# Altium footprint library Iris.PcbLib: 90 footprints (part 4 of 6)
Each footprint in its own frame and in the unit in brackets; x right, y up, seen from the top. Pads: shape width x height; smd on the part's side, far side on the other; paste and mask are expansions set on the pad; w line width, h text height; cw(c..) or ccw(c..) is an arc to the next point about the centre after c.
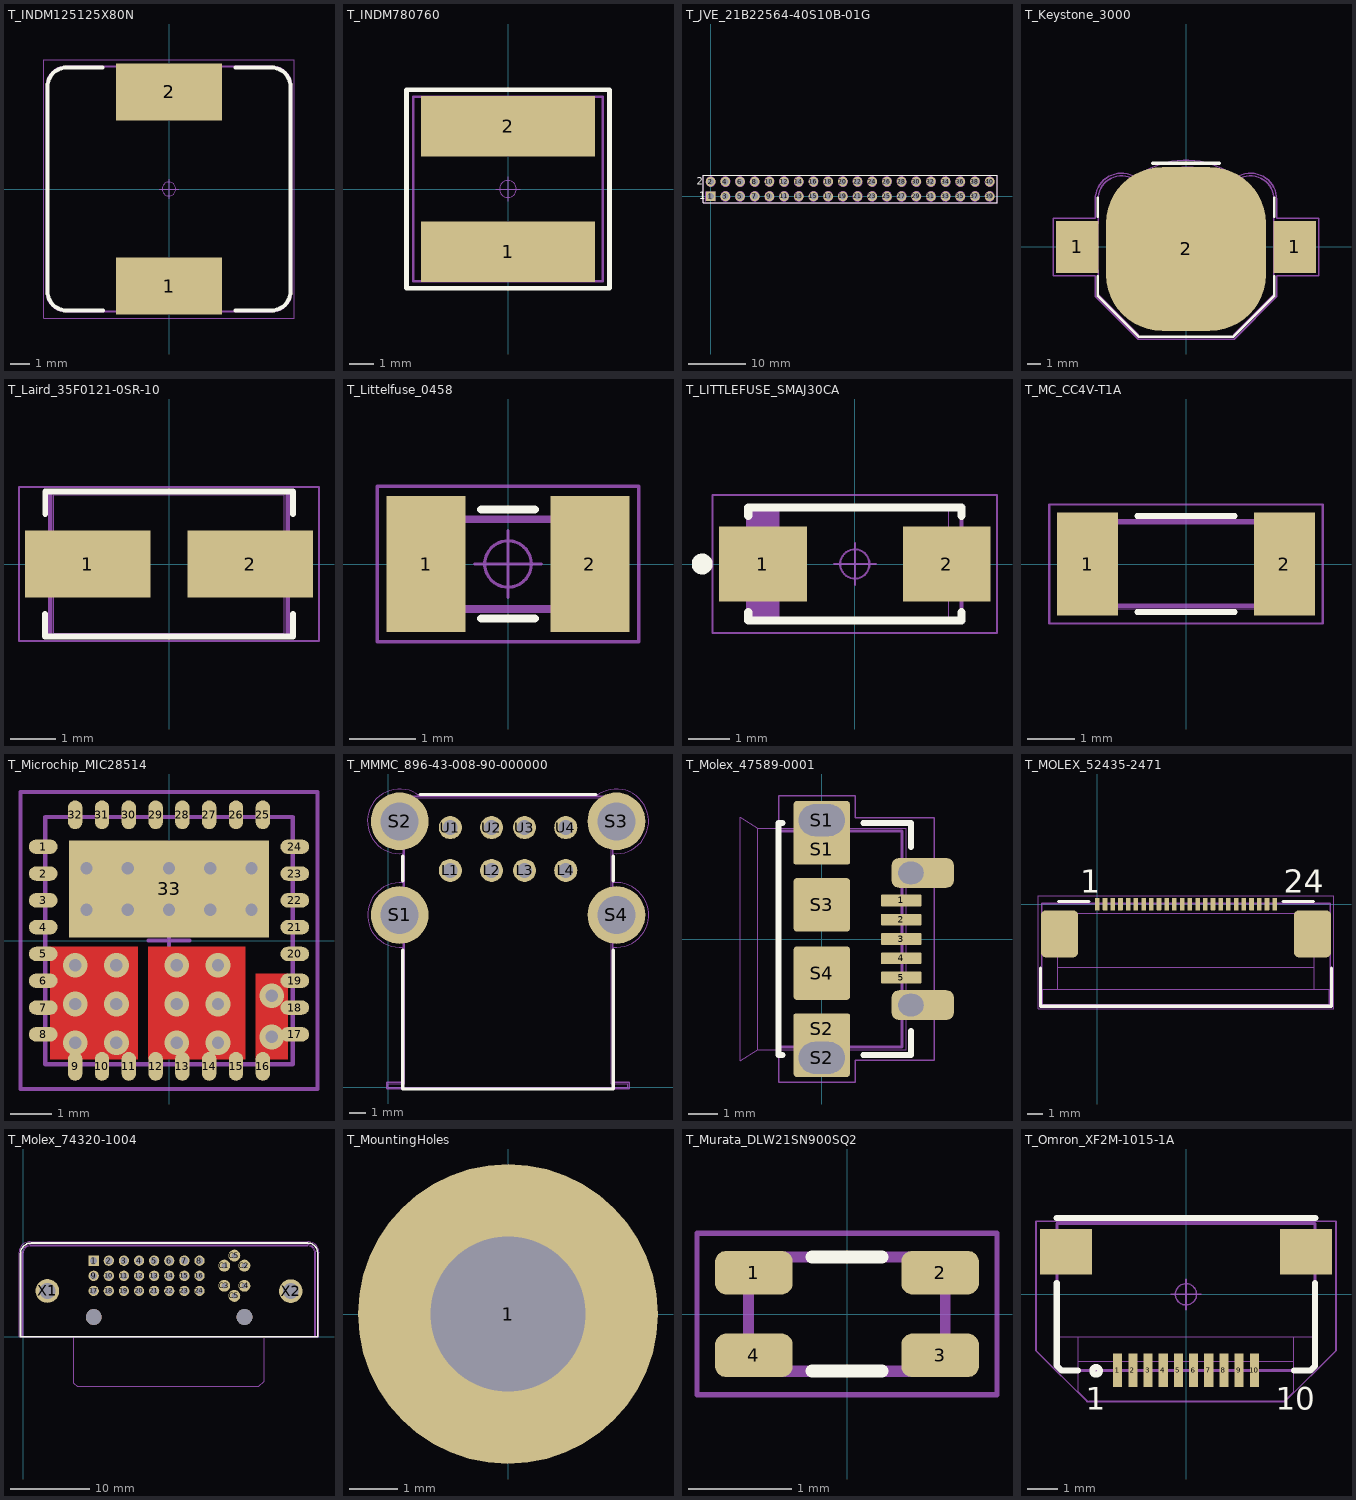
[diagram p3: the footprints below, top view; thin cyan lines are the x and y axes]

## T_INDM125125X80N [mm] "Inductor shielded, 12.5mm X 12.5mm"
height 6
pads (2):
  rect 5.4x2.9 smd: 1(0,-4.95) 2(0,4.95)
Top Overlay:
  lines w0.2: -3.39,6.2 -5.2,6.2 ccw(c-5.2,5.2) -6.2,5.2 -6.2,-5.2 ccw(c-5.2,-5.2) -5.2,-6.2 -3.373,-6.2 ; 3.382,-6.2 5.2,-6.2 ccw(c5.2,-5.2) 6.2,-5.2 6.2,5.2 ccw(c5.2,5.2) 5.2,6.2 ; 3.393,6.196 5.2,6.196
Mechanical 1:
  circle w0.05: c0,0 r0.35
  lines w0.05: -0.5,0 0.5,0 ; 0,-0.5 0,0.5 ; -6.4,-6.6 -6.4,6.6 6.4,6.6 6.4,-6.6 -6.4,-6.6
Mechanical 2:
  lines w0.005: -6.25,-5.25 ccw(c-5.25,-5.25) -5.251,-6.25 5.25,-6.25 ccw(c5.25,-5.25) 6.25,-5.251 6.25,5.25 ccw(c5.25,5.25) 5.251,6.25 -5.25,6.25 ccw(c-5.25,5.25) -6.25,5.251 -6.25,-5.25
Mechanical 3:
  lines w0.1: -6.25,-5.25 ccw(c-5.25,-5.25) -5.251,-6.25 5.25,-6.25 ccw(c5.25,-5.25) 6.25,-5.251 6.25,5.25 ccw(c5.25,5.25) 5.251,6.25 -5.25,6.25 ccw(c-5.25,5.25) -6.25,5.251 -6.25,-5.25
3D body "srr1260-330m.stp": height 6, standoff 0, extent -6.25,-6.25 6.25,6.25

## T_INDM780760 [mm] "Inductor shielded, 7.80mm x 7.60mm (Pulse, PA5007.332NLT; Abracon, ASPIAIG-F7030-3R3M-T)"
height 3.5
pads (2):
  rect 7.2x2.5 smd: 1(0,-2.6) 2(0,2.6)
Top Overlay:
  lines w0.2: -4.2,-4.1 -4.2,4.1 4.2,4.1 4.2,-4.1 -4.2,-4.1
Mechanical 1:
  circle w0.05: c0,0 r0.35
  lines w0.05: -0.5,0 0.5,0 ; 0,-0.5 0,0.5 ; -4.191,-4.089 4.191,-4.089 4.191,4.089 -4.191,4.089 -4.191,-4.089
Mechanical 2:
  lines w0.01: -3.9,-3.8 -3.9,3.8 3.9,3.8 3.9,-3.8 -3.9,-3.8 ; -3.1,-3.722 3.1,-3.722 3.1,-1.772 -3.1,-1.772 -3.1,-3.722 ; -3.1,1.772 3.1,1.772 3.1,3.722 -3.1,3.722 -3.1,1.772
Mechanical 3:
  lines w0.1: -3.912,-3.81 -3.912,3.81 3.912,3.81 3.912,-3.81 -3.912,-3.81
3D body: height 3.1, standoff 0.2, extent -3.9,-3.8 3.9,3.8

## T_JVE_21B22564-40S10B-01G [mm] "Header 2x20"
height 8.6
pads (40):
  rect 1.65x1.65 hole 1.15: 1(0,0)
  round 1.65 hole 1.15: 2(0,2.54) 3(2.54,0) 4(2.54,2.54) 5(5.08,0) 6(5.08,2.54) 7(7.62,0) 8(7.62,2.54) 9(10.16,0) 10(10.16,2.54) 11(12.7,0) 12(12.7,2.54) 13(15.24,0) 14(15.24,2.54) 15(17.78,0) 16(17.78,2.54) 17(20.32,0) 18(20.32,2.54) 19(22.86,0) 20(22.86,2.54) 21(25.4,0) 22(25.4,2.54) 23(27.94,0) 24(27.94,2.54) 25(30.48,0) 26(30.48,2.54) 27(33.02,0) 28(33.02,2.54) 29(35.56,0) 30(35.56,2.54) 31(38.1,0) 32(38.1,2.54) 33(40.64,0) 34(40.64,2.54) 35(43.18,0) 36(43.18,2.54) 37(45.72,0) 38(45.72,2.54) 39(48.26,0) 40(48.26,2.54)
Top Overlay:
  lines w0.2: -1.27,-1.14 49.53,-1.14 49.53,3.68 -1.27,3.68 -1.27,-1.137
  text "2" at -2.364,2.048 h1.27
  text "1" at -1.941,-0.522 h1.27
Mechanical 1:
  circle w0.05: c0,0 r0.35
  lines w0.05: -1.27,-1.14 49.53,-1.14 49.53,3.68 -1.27,3.68 -1.27,-1.137 ; -0.5,0 0.5,0 ; 0,-0.5 0,0.5
Mechanical 2:
  lines w0.001: -1.27,-1.14 49.53,-1.14 49.53,3.68 -1.27,3.68 -1.27,-1.14
Mechanical 3:
  circle w0.1: c0,2.54 r0.825
  circle w0.1: c2.54,0 r0.825
  circle w0.1: c2.54,2.54 r0.825
  circle w0.1: c5.08,0 r0.825
  circle w0.1: c5.08,2.54 r0.825
  circle w0.1: c7.62,0 r0.825
  circle w0.1: c7.62,2.54 r0.825
  circle w0.1: c10.16,0 r0.825
  circle w0.1: c10.16,2.54 r0.825
  circle w0.1: c12.7,0 r0.825
  circle w0.1: c12.7,2.54 r0.825
  circle w0.1: c15.24,0 r0.825
  circle w0.1: c15.24,2.54 r0.825
  circle w0.1: c17.78,0 r0.825
  circle w0.1: c17.78,2.54 r0.825
  circle w0.1: c20.32,0 r0.825
  circle w0.1: c20.32,2.54 r0.825
  circle w0.1: c22.86,0 r0.825
  circle w0.1: c22.86,2.54 r0.825
  circle w0.1: c25.4,0 r0.825
  circle w0.1: c25.4,2.54 r0.825
  circle w0.1: c27.94,0 r0.825
  circle w0.1: c27.94,2.54 r0.825
  circle w0.1: c30.48,0 r0.825
  circle w0.1: c30.48,2.54 r0.825
  circle w0.1: c33.02,0 r0.825
  circle w0.1: c33.02,2.54 r0.825
  circle w0.1: c35.56,0 r0.825
  circle w0.1: c35.56,2.54 r0.825
  circle w0.1: c38.1,0 r0.825
  circle w0.1: c38.1,2.54 r0.825
  circle w0.1: c40.64,0 r0.825
  circle w0.1: c40.64,2.54 r0.825
  circle w0.1: c43.18,0 r0.825
  circle w0.1: c43.18,2.54 r0.825
  circle w0.1: c45.72,0 r0.825
  circle w0.1: c45.72,2.54 r0.825
  circle w0.1: c48.26,0 r0.825
  circle w0.1: c48.26,2.54 r0.825
  lines w0.1: -1.27,-1.14 49.53,-1.14 49.53,3.68 -1.27,3.68 -1.27,-1.137 ; -0.825,-0.825 -0.825,0.825 0.825,0.825 0.825,-0.825
3D body "TSW-120-07-X-D.step": height 8.4, standoff -2.52, extent -1.27,-1.27 49.53,3.81

## T_Keystone_3000 [mm] "Battery Holder"
height 3.2
pads (3):
  rect 3.2x3.9 smd: 1(-8.17,0) 1(8.17,0)
  rrect70% 12x12.3 smd paste-11: 2(0,-0.15)
Top Overlay:
  lines w0.2: -6.631,-2.21 -6.631,-3.638 -3.517,-6.752 3.523,-6.752 3.523,-6.746 6.631,-3.638 6.631,-2.21 ; -6.631,2.261 -6.631,3.689 ; 6.631,2.261 6.631,3.689
  lines w0.254: -2.5,6.3 2.5,6.3
Mechanical 1:
  lines w0.1: -6.808,3.568 cw(c-4.849,3.588) -3.782,5.231 ; -6.808,3.588 -6.808,2.159 -9.982,2.159 -9.982,-2.159 -6.807,-2.159 -6.807,-3.683 -3.581,-6.909 3.607,-6.909 6.833,-3.683 6.833,-2.159 9.982,-2.159 9.982,2.159 6.809,2.159 6.809,3.57 ; -3.785,5.233 cw(c0,0.323) 3.785,5.233 ; 3.782,5.231 cw(c4.849,3.588) 6.807,3.568
Mechanical 2:
  circle w0.001: c-8.185,0 r1.2
  circle w0.001: c8.185,0 r1.2
  circle w0.001: c0,0 r6
  lines w0.001: -6.605,-1.585 -9.46,-1.585 -9.46,1.585 -6.605,1.585 ; -6.605,3.588 -6.605,-3.57 -6.59,-3.57 -3.57,-6.59 -3.57,-6.725 3.57,-6.725 3.57,-6.59 6.59,-3.57 6.605,-3.57 6.605,3.588 ; -6.605,3.57 cw(c-4.849,3.588) -3.585,4.808 ccw(c0,9.619) 3.586,4.808 cw(c4.849,3.588) 6.605,3.57 ; -3.57,5.345 3.57,5.345 ; 6.605,-1.585 9.46,-1.585 9.46,1.585 6.605,1.585
Mechanical 3:
  lines w0.1: -6.605,-1.723 -6.605,-3.57 -6.59,-3.57 -3.57,-6.59 -3.57,-6.725 3.57,-6.725 3.57,-6.59 6.59,-3.57 6.605,-3.57 6.605,-1.723 ; -6.604,-1.723 -9.578,-1.723 -9.578,1.727 -6.605,1.727 -6.605,3.57 cw(c-4.849,3.588) -3.585,4.808 ccw(c0,9.619) 3.586,4.808 cw(c4.849,3.588) 6.605,3.57 ; 6.604,-1.724 9.575,-1.724 9.575,1.73 6.605,1.73 ; 6.605,1.727 6.605,3.57
3D body "keystone-PN3000.STEP": height 3.16, standoff -0.01, extent -9.474,-6.72 9.474,5.345

## T_Laird_35F0121-0SR-10 [mm] "Power supply FB 10A"
height 3.05
pads (2):
  rect 2.77x1.47 smd: 1(-1.79,0) 2(1.79,0)
Top Overlay:
  lines w0.127: -2.732,-1.102 -2.732,-1.599 2.73,-1.599 2.73,-1.104 ; -2.729,1.104 -2.729,1.599 2.73,1.599 2.73,1.104
Mechanical 1:
  lines w0.05: -3.306,-1.695 3.305,-1.695 3.305,1.695 -3.306,1.695 -3.306,-1.695
Mechanical 2:
  lines w0.001: -2.54,-1.525 2.54,-1.525 2.54,1.525 -2.54,1.525 -2.54,-1.525
Mechanical 3:
  lines w0.1: -2.614,-1.599 -2.614,1.599 2.614,1.599 2.614,-1.599 -2.614,-1.599
3D body: height 3.05, standoff 0, extent -2.54,-1.525 2.54,1.525

## T_Littelfuse_0458 [mm] "Fast Fuse"
height 1.575
pads (2):
  rect 1.185x2.05 smd: 1(-1.232,0) 2(1.232,0)
Top Overlay:
  lines w0.127: -0.4,-0.82 0.4,-0.82 ; -0.4,0.82 0.4,0.82
Mechanical 1:
  circle w0.05: c0,0 r0.35
  lines w0.05: -0.5,0 0.5,0 ; 0,-0.5 0,0.5 ; -1.97,-1.17 1.97,-1.17 1.97,1.17 -1.97,1.17 -1.97,-1.17
Mechanical 2:
  lines w0.005: -1.587,-0.725 1.587,-0.725 1.587,0.725 -1.587,0.725 -1.587,-0.725
Mechanical 3:
  lines w0.1: -1.53,-0.67 1.53,-0.67 1.53,0.67 -1.53,0.67 -1.53,-0.67
3D body "User Library-Fast Acting Surface-Mount Fuses (1).step": height 1.1, standoff 0, extent -1.51,-0.801 1.51,0.801

## T_LITTLEFUSE_SMAJ30CA [mm] "Bidirectional ESD protection"
height 2.29
pads (2):
  rect 2.1x1.8 smd: 1(-2.2,0) 2(2.2,0)
Top Overlay:
  circle w0.25: c-3.65,0 r0.125
  lines w0.2: -2.55,-1.15 -2.55,-1.35 2.55,-1.35 2.55,-1.15 ; -2.55,1.15 -2.55,1.35 2.55,1.35 2.55,1.15
Mechanical 1:
  circle w0.05: c0,0 r0.35
  lines w0.05: -0.5,0 0.5,0 ; 0,-0.5 0,0.5 ; -3.4,-1.65 -3.4,1.65 3.4,1.65 3.4,-1.65 -3.4,-1.65
Mechanical 2:
  lines w0.001: -2.25,-1.395 -2.25,1.395 2.25,1.395 2.25,-1.395 -2.25,-1.395
Mechanical 3:
  lines w0.1: -2.452,-1.332 -2.452,1.332 ; -2.352,-1.332 -2.352,1.332 ; -2.252,-1.332 -2.252,1.332 ; -2.152,-1.332 -2.152,1.332 ; -2.052,-1.332 -2.052,1.332 ; -1.952,-1.332 -1.952,1.332 ; -1.852,-1.332 -1.852,1.332 ; -2.552,-1.332 -2.552,1.332 ; -2.552,-1.332 -2.552,1.332 ; -2.552,-1.332 2.552,-1.332 2.552,1.332 -2.552,1.332
3D body: height 2.29, standoff 0, extent -2.25,-1.395 2.25,1.395

## T_MC_CC4V-T1A [mm]
height 0.9
pads (2):
  rect 1.3x2.2 smd: 1(-2.1,0) 2(2.1,0)
Top Overlay:
  lines w0.127: -1.04,-1.02 1.04,-1.02 ; -1.04,1.02 1.04,1.02
Mechanical 1:
  lines w0.05: -2.92,-1.27 2.92,-1.27 2.92,1.27 -2.92,1.27 -2.92,-1.27
Mechanical 2:
  lines w0.001: -2.5,-0.95 2.5,-0.95 2.5,0.95 -2.5,0.95 -2.5,-0.95
Mechanical 3:
  lines w0.1: -2.44,-0.89 -2.44,0.89 2.44,0.89 2.44,-0.89 -2.44,-0.89
3D body: height 2.29, standoff 0, extent -2.5,-0.95 2.5,0.95

## T_Microchip_MIC28514 [mm] "75V/5A DC-DC Switching Buck Regulator with External Soft Start"
height 0.9
pads (33):
  oval 0.7x0.35 smd: 1(-3.05,2.275) 2(-3.05,1.625) 3(-3.05,0.975) 4(-3.05,0.325) 5(-3.05,-0.325) 6(-3.05,-0.975) 7(-3.05,-1.625) 8(-3.05,-2.275) 17(3.05,-2.275) 18(3.05,-1.625) 19(3.05,-0.975) 20(3.05,-0.325) 21(3.05,0.325) 22(3.05,0.975) 23(3.05,1.625) 24(3.05,2.275)
  oval 0.35x0.7 smd: 9(-2.275,-3.05) 10(-1.625,-3.05) 11(-0.975,-3.05) 12(-0.325,-3.05) 13(0.325,-3.05) 14(0.975,-3.05) 15(1.625,-3.05) 16(2.275,-3.05) 25(2.275,3.05) 26(1.625,3.05) 27(0.975,3.05) 28(0.325,3.05) 29(-0.325,3.05) 30(-0.975,3.05) 31(-1.625,3.05) 32(-2.275,3.05)
  rect 4.85x2.36 smd paste-0.5: 33(0,1.25)
via -2,1.75 diameter 0.6 hole 0.3
via -1,1.75 diameter 0.6 hole 0.3
via 0,0.75 diameter 0.6 hole 0.3
via -1,0.75 diameter 0.6 hole 0.3
via 0,1.75 diameter 0.6 hole 0.3
via 1,1.75 diameter 0.6 hole 0.3
via 2,1.75 diameter 0.6 hole 0.3
via 1,0.75 diameter 0.6 hole 0.3
via 2,0.75 diameter 0.6 hole 0.3
via -1.275,-2.48 diameter 0.6 hole 0.3
via -2.275,-1.54 diameter 0.6 hole 0.3
via -2.275,-0.6 diameter 0.6 hole 0.3
via -1.275,-1.54 diameter 0.6 hole 0.3
via -1.275,-0.6 diameter 0.6 hole 0.3
via 2.489,-1.337 diameter 0.6 hole 0.3
via 2.489,-2.337 diameter 0.6 hole 0.3
via 1.187,-2.48 diameter 0.6 hole 0.3
via 0.187,-1.54 diameter 0.6 hole 0.3
via 0.187,-2.48 diameter 0.6 hole 0.3
via 0.187,-0.6 diameter 0.6 hole 0.3
via 1.187,-1.54 diameter 0.6 hole 0.3
via 1.187,-0.6 diameter 0.6 hole 0.3
via -2.275,-2.48 diameter 0.6 hole 0.3
via -2,0.75 diameter 0.6 hole 0.3
Top Layer:
  region: 2.1,-0.8 2.877,-0.8 2.877,-2.878 2.1,-2.878
  region: -0.5,-0.15 1.845,-0.15 1.845,-2.878 -0.5,-2.878
  region: -2.875,-0.15 -0.755,-0.15 -0.755,-2.878 -2.875,-2.878
Mechanical 1:
  lines w0.1: -0.5,0 0.5,0 ; 0,-0.5 0,0.5 ; -3.6,-3.6 3.6,-3.6 3.6,3.6 -3.6,3.6 -3.6,-3.6
Mechanical 3:
  lines w0.1: -3,-3 3,-3 3,3 -3,3 -3,-3
3D body: height 0.9, standoff 0.05, extent -3,-3 3,3

## T_MMMC_896-43-008-90-000000 [mm] "USB 2.0 double row, Type A"
height 15.6
pads (12):
  round 1.4 hole 0.9: L1(3.75,13.13) L2(6.25,13.13) L3(8.25,13.13) L4(10.75,13.13) U1(3.75,15.73) U2(6.25,15.73) U3(8.25,15.73) U4(10.75,15.73)
  round 3.5 hole 2.3: S1(0.68,10.43) S2(0.68,16.11) S3(13.82,16.11) S4(13.82,10.43)
Top Overlay:
  lines w0.2: 0.875,8.3 0.875,-0.12 13.625,-0.12 13.625,8.3 ; 0.875,12.5 0.875,14 ; 1.91,17.73 12.58,17.73 ; 13.625,12.5 13.625,14
Mechanical 1:
  lines w0.05: 0.901,8.484 0.901,0.299 -0.099,0.299 -0.099,-0.099 14.599,-0.099 14.599,0.299 13.599,0.299 13.599,8.485 ; 0.901,12.374 0.901,14.164 ; 0.902,8.484 cw(c0.685,10.429) 0.904,12.374 ; 0.903,14.164 cw(c0.679,16.109) 1.895,17.643 1.91,17.628 12.582,17.628 ; 12.582,17.631 cw(c13.815,16.11) 13.598,14.165 ; 13.599,12.375 13.599,14.165 ; 13.599,12.376 cw(c13.815,10.43) 13.6,8.485
Mechanical 2:
  lines w0.001: 0,0 0,0.2 1,0.2 1,17.53 13.5,17.53 13.5,0.2 14.5,0.2 14.5,0 0,0
Mechanical 3:
  lines w0.1: 0.9,0.299 0.9,17.629 13.599,17.629 13.599,0.299 14.6,0.299 14.6,-0.099 -0.099,-0.099 -0.099,0.299 0.901,0.299
3D body "61400826021.stp": height 16.17, standoff -3.58, extent -0.45,0 14.95,17.53

## T_Molex_47589-0001 [mm] "Micro USB Connector"
height 2.5
pads (13):
  rrect12% 1.35x0.4 smd: 1(2.675,1.3) 2(2.675,0.65) 3(2.675,0) 4(2.675,-0.65) 5(2.675,-1.3)
  rrect12% 1.9x1 smd: S1(0,3.013) S2(0,-3.013)
  rrect12% 1.9x2.1 hole 1.07 slot 1.55 at 0 deg copper offset 0,-0.4: S1(0,4)
  rrect12% 1.9x2.1 hole 1.07 slot 1.55 at 0 deg copper offset 0,0.4: S2(0,-4)
  rrect12% 1.9x1.8 smd: S3(0,1.15) S4(0,-1.15)
  rrect50% 2.1x1 hole 0.75 slot 0.85 at 0 deg copper offset 0.4,0: ""(3,-2.225) ""(3,2.225)
Top Overlay:
  lines w0.2: -1.32,-3.91 -1.45,-3.91 -1.45,3.91 -1.32,3.91 ; 1.397,-3.91 3,-3.91 3,-3.099 ; 1.397,3.91 3,3.91 ; 3.01,3.099 3.01,3.91
Top Paste:
  rectangle: 3.299,1.724 4.194,2.724
  rectangle: 4.174,1.971 4.448,2.478
  rectangle: 4.174,-2.479 4.448,-1.972
  rectangle: 3.299,-2.726 4.194,-1.726
  lines w0.4: 4.193,-2.525 ccw(c4.196,-2.472) 4.248,-2.475 ; 4.193,1.925 ccw(c4.196,1.978) 4.248,1.975 ; 4.194,-1.927 cw(c4.198,-1.976) 4.248,-1.972 ; 4.194,2.523 cw(c4.198,2.474) 4.248,2.478
Mechanical 1:
  lines w0.05: -1.45,-4.83 -1.45,4.83 1.13,4.83 1.13,4.08 3.79,4.08 3.79,-4.08 1.13,-4.08 1.13,-4.83 -1.45,-4.83
Mechanical 2:
  lines w0.001: -2.15,-3.725 2.85,-3.725 2.85,3.725 -2.15,3.725 ; -2.15,-3.725 -2.15,3.725 ; -2.15,-3.725 -2.75,-4.1 -2.75,4.1 -2.15,3.725
Mechanical 3:
  lines w0.1: -1.45,-3.64 2.7,-3.64 2.7,3.64 -1.45,3.64 -1.45,-3.64
3D body "ZX62RD-AB-5P8.stp": height 2.79, standoff -0.58, extent -2.75,-4.325 3.149,4.325

## T_MOLEX_52435-2471 [mm] "DVI FFC Connector 0.5mm pitch"
height 2
pads (26):
  rrect12% 0.3x0.8 smd: 1(0,0) 2(0.5,0) 3(1,0) 4(1.5,0) 5(2,0) 6(2.5,0) 7(3,0) 8(3.5,0) 9(4,0) 10(4.5,0) 11(5,0) 12(5.5,0) 13(6,0) 14(6.5,0) 15(7,0) 16(7.5,0) 17(8,0) 18(8.5,0) 19(9,0) 20(9.5,0) 21(10,0) 22(10.5,0) 23(11,0) 24(11.5,0)
  rrect25% 2.4x3.05 smd: ""(-2.45,-1.925) ""(13.95,-1.925)
Top Overlay:
  lines w0.2: -3.672,-4.125 -3.672,-6.62 15.175,-6.62 15.175,-4.125 ; -2.5,0.175 -0.55,0.175 ; 12.05,0.175 14,0.175
  text "1" at -1.1,0.75 h1.5
  text "24" at 12.1,0.75 h1.5
Mechanical 1:
  lines w0.05: -3.816,-6.766 15.316,-6.766 15.316,0.543 -3.816,0.543 -3.816,-6.766
Mechanical 2:
  lines w0.001: -2.55,-5.5 -2.55,-0.6 14.05,-0.6 14.05,-5.5 ; -2.55,-4.1 14.05,-4.1 ; -3.55,-6.5 -3.55,-5.5 15.05,-5.5 15.05,-6.5 -3.55,-6.5
Mechanical 3:
  lines w0.1: -3.61,-6.558 -3.61,0.044 15.109,0.044 15.109,-6.558 -3.61,-6.558
3D body "524352471.stp": height 2.07, standoff 0.02, extent -3.55,-6.2 15.05,0.4

## T_Molex_74320-1004 [mm] "DVI-Connectors"
height 12.7
pads (34):
  rect 1.3x1.3 hole 0.9: 1(8.89,9.63)
  round 1.3 hole 0.9: 2(10.8,9.63) 3(12.71,9.63) 4(14.62,9.63) 5(16.53,9.63) 6(18.44,9.63) 7(20.35,9.63) 8(22.26,9.63) 9(8.89,7.72) 10(10.8,7.72) 11(12.71,7.72) 12(14.62,7.72) 13(16.53,7.72) 14(18.44,7.72) 15(20.35,7.72) 16(22.26,7.72) 17(8.89,5.81) 18(10.8,5.81) 19(12.71,5.81) 20(14.62,5.81) 21(16.53,5.81) 22(18.44,5.81) 23(20.35,5.81) 24(22.26,5.81)
  round 1.5 hole 0.7: C1(25.39,9.01) C2(27.94,9.01) C3(25.39,6.46) C4(27.94,6.46) C5(26.665,5.185) C5(26.665,10.285)
  round 3 hole 2: X1(3.04,5.81) X2(33.79,5.785)
  round 2 hole 2 unplated paste+0 mask+0: ""(8.89,2.51) ""(27.94,2.51)
Top Overlay:
  lines w0.2: 0.978,11.866 ccw(c0.978,10.532) -0.356,10.532 -0.356,0 37.181,0 37.181,10.626 ; 0.978,11.868 35.936,11.868 cw(c35.936,10.626) 37.178,10.626
Mechanical 1:
  lines w0.05: -0.545,10.627 cw(c0.873,10.627) 0.873,12.045 ; -0.544,10.631 -0.544,0 37.36,0 37.36,10.64 ; 0.863,12.045 35.96,12.045 ; 35.942,12.044 cw(c35.942,10.626) 37.36,10.626
Mechanical 2:
  lines w0.001: 0,10.67 0,0 36.83,0 ; 0.001,10.65 cw(c0.85,10.65) 0.85,11.499 ; 0.84,11.499 35.968,11.499 cw(c35.968,10.65) 36.816,10.65 ; 6.4,0 6.4,-5.829 6.821,-6.25 29.76,-6.25 30.43,-5.581 ; 30.43,-5.581 30.43,0 ; 36.818,0.052 36.818,10.68
Mechanical 3:
  lines w0.1: -0.122,10.635 cw(c0.874,10.635) 0.874,11.63 35.923,11.63 cw(c35.923,10.604) 36.949,10.604 36.949,0 -0.119,0 -0.119,10.626
3D body "675024321321.stp": height 10.22, standoff -2.93, extent -0.335,-6.25 37.165,11.55

## T_MountingHoles [mm] "PCB Mounting Holes"
pads (1):
  round 6.2 hole 3.2: 1(0,0)

## T_Murata_DLW21SN900SQ2 [mm] "Common Mode Choke"
height 1.2
pads (4):
  rrect50% 0.75x0.42 smd: 1(-0.9,0.4) 2(0.9,0.4) 3(0.9,-0.4) 4(-0.9,-0.4)
Top Overlay:
  lines w0.127: -0.34,-0.55 0.34,-0.55 ; -0.34,0.55 0.34,0.55
Mechanical 1:
  lines w0.05: -1.45,-0.78 -1.45,0.78 1.45,0.78 1.45,-0.78 -1.45,-0.78
Mechanical 2:
  lines w0.001: -1,-0.6 -1,0.6 1,0.6 1,-0.6 -1,-0.6
Mechanical 3:
  lines w0.1: -0.95,-0.55 -0.95,0.55 0.95,0.55 0.95,-0.55 -0.95,-0.55
3D body: height 1.2, standoff 0, extent -1,-0.6 1,0.6

## T_Omron_XF2M-1015-1A [mm] "FFC Connector, Rotart Lock, Top Bottom Contact 0.5mm pitch"
height 2
pads (12):
  rect 0.3x1.1 smd: 1(-2.25,-2.5) 2(-1.75,-2.5) 3(-1.25,-2.5) 4(-0.75,-2.5) 5(-0.25,-2.5) 6(0.25,-2.5) 7(0.75,-2.5) 8(1.25,-2.5) 9(1.75,-2.5) 10(2.25,-2.5)
  rect 1.7x1.5 smd: ""(-3.95,1.4) ""(3.95,1.4)
Top Overlay:
  circle w0.2: c-2.959,-2.519 r0.125
  lines w0.2: -4.252,0.369 -4.252,-2.348 -4.1,-2.5 -3.55,-2.5 ; -4.252,2.507 4.252,2.507 ; 3.55,-2.5 4.1,-2.5 4.25,-2.35 4.25,0.367
  text "1" at -3.3,-3.8 h0.75
  text "10" at 2.95,-3.8 h0.75
Mechanical 1:
  circle w0.05: c0,0 r0.35
  lines w0.05: -0.5,0 0.5,0 ; 0,-0.5 0,0.5 ; -4.936,-1.853 -3.261,-3.528 3.262,-3.528 4.936,-1.854 4.936,2.4 -4.936,2.4 -4.936,-1.853
Mechanical 2:
  lines w0.001: -4.25,-1.4 4.25,-1.4 ; -3.55,-2.5 -4.1,-2.5 -4.25,-2.35 -4.25,0.9 -4.55,0.9 -4.55,2 -4.25,2 -4.25,2.4 4.25,2.4 4.25,2 4.55,2 4.55,0.9 4.25,0.9 4.25,-2.35 4.1,-2.5 3.55,-2.5 ; -3.55,-2.2 3.55,-2.2 ; -3.55,-1.4 -3.55,-3.2 -3.25,-3.5 ; -3.2,-3.5 3.3,-3.5 ; 3.25,-3.5 3.55,-3.2 3.55,-1.4
Mechanical 3:
  lines w0.1: 4.25,2.334 4.25,-2.35 4.1,-2.5 -4.1,-2.5 -4.252,-2.348 -4.252,2.334 4.252,2.334
3D body "XF2M_1015_1A.step": height 2, standoff 0, extent -4.55,-3.5 4.55,2.4